# Altium footprint library Project_Oshinoko.PcbLib: 211 footprints (part 12 of 14)
Each footprint in its own frame and in the unit in brackets; x right, y up, seen from the top. Pads: shape width x height; smd on the part's side, far side on the other; paste and mask are expansions set on the pad; w line width, h text height; cw(c..) or ccw(c..) is an arc to the next point about the centre after c.
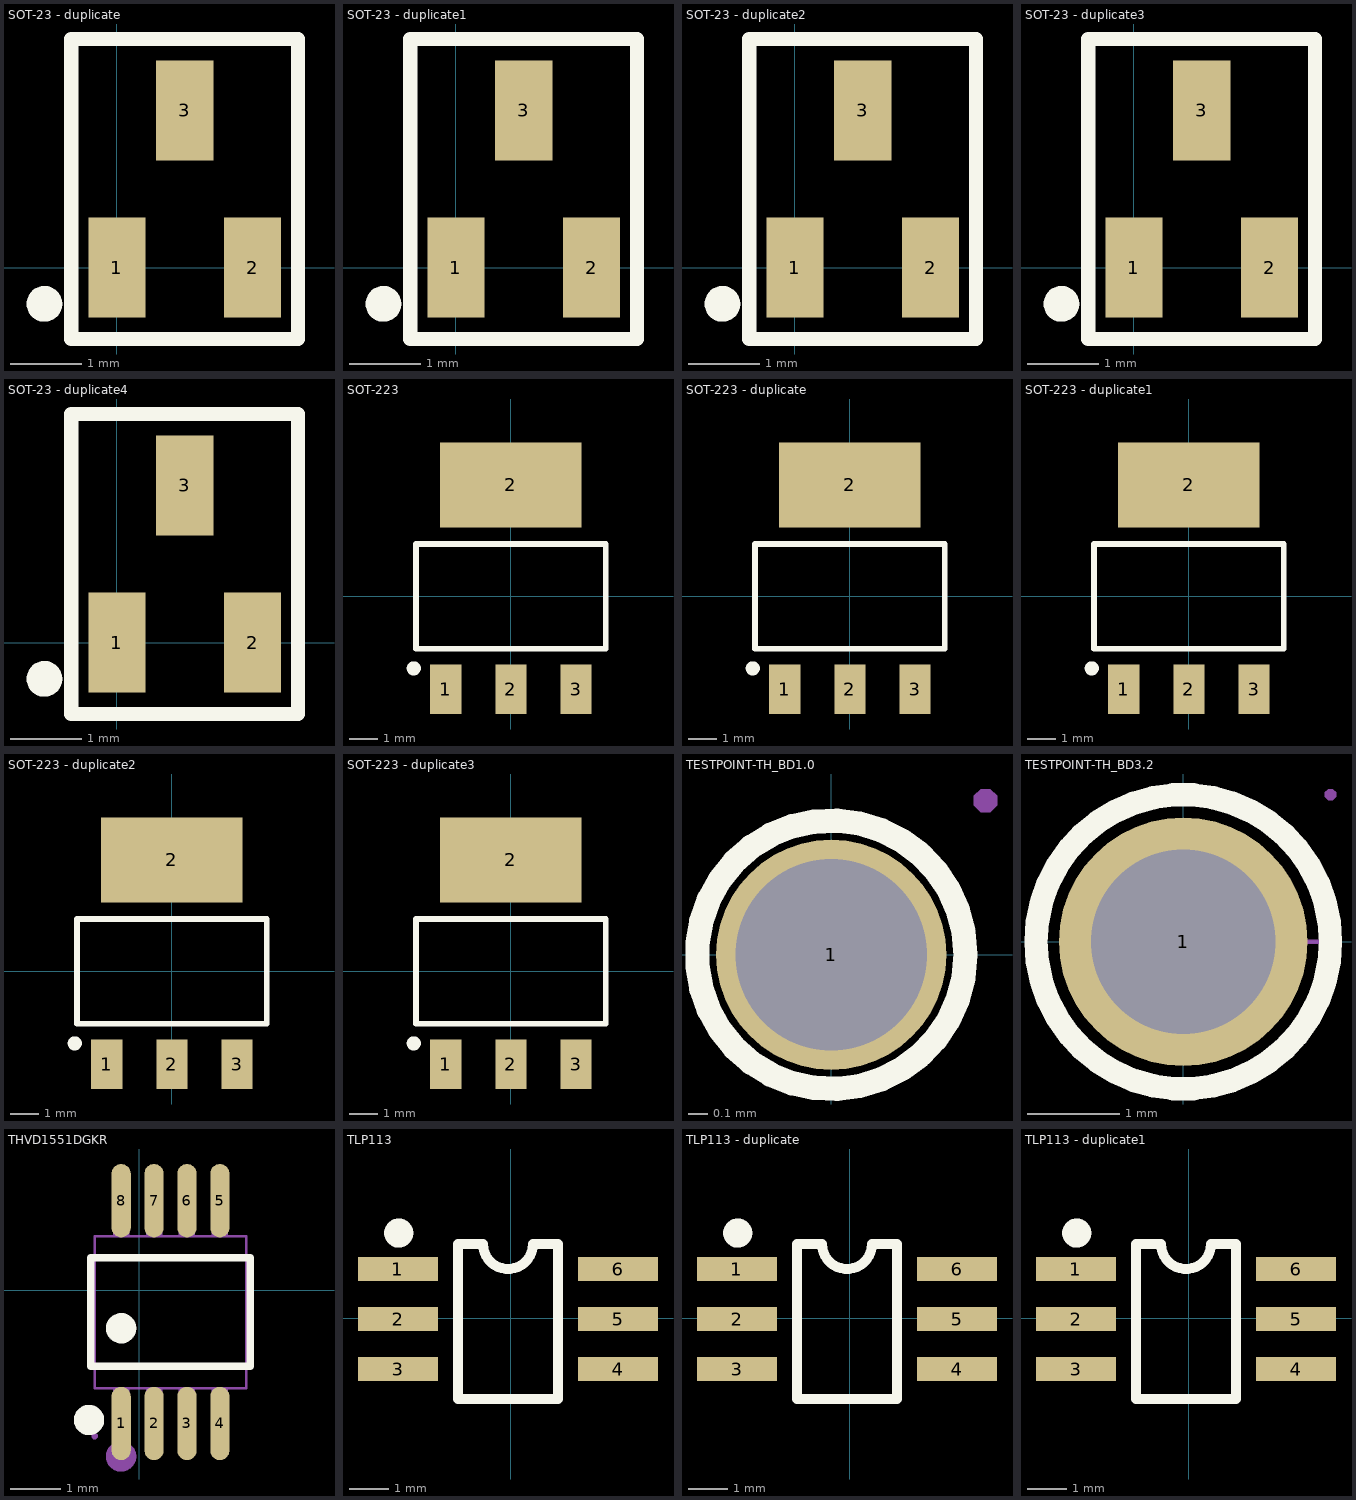
[diagram p11: the footprints below, top view; thin cyan lines are the x and y axes]

## SOT-23 - duplicate [mm]
pads (3):
  rect 0.8x1.4 smd: 1(0,0) 2(1.9,0) 3(0.95,2.2)
Top Overlay:
  circle w0.25: c-1.014,-0.508 r0.125
  lines w0.2: -0.637,-1 2.538,-1 2.538,3.2 -0.637,3.2 -0.637,-1

## SOT-23 - duplicate1 [mm]
pads (3):
  rect 0.8x1.4 smd: 1(0,0) 2(1.9,0) 3(0.95,2.2)
Top Overlay:
  circle w0.25: c-1.014,-0.508 r0.125
  lines w0.2: -0.637,-1 2.538,-1 2.538,3.2 -0.637,3.2 -0.637,-1

## SOT-23 - duplicate2 [mm]
pads (3):
  rect 0.8x1.4 smd: 1(0,0) 2(1.9,0) 3(0.95,2.2)
Top Overlay:
  circle w0.25: c-1.014,-0.508 r0.125
  lines w0.2: -0.637,-1 -0.637,3.2 2.538,3.2 2.538,-1 -0.637,-1

## SOT-23 - duplicate3 [mm]
pads (3):
  rect 0.8x1.4 smd: 1(0,0) 2(1.9,0) 3(0.95,2.2)
Top Overlay:
  circle w0.25: c-1.014,-0.508 r0.125
  lines w0.2: -0.637,-1 -0.637,3.2 2.538,3.2 2.538,-1 -0.637,-1

## SOT-23 - duplicate4 [mm]
pads (3):
  rect 0.8x1.4 smd: 1(0,0) 2(1.9,0) 3(0.95,2.2)
Top Overlay:
  circle w0.25: c-1.014,-0.508 r0.125
  lines w0.2: -0.637,-1 2.538,-1 2.538,3.2 -0.637,3.2 -0.637,-1

## SOT-223 [mm]
pads (4):
  rect 1.1x1.75 smd: 1(-2.3,-3.275) 2(0,-3.275) 3(2.3,-3.275)
  rect 5x3 smd: 2(0,3.937)
Top Overlay:
  circle w0.25: c-3.427,-2.54 r0.125
  lines w0.2: -3.35,-1.85 3.35,-1.85 3.35,1.85 -3.35,1.85 -3.35,-1.85

## SOT-223 - duplicate [mm]
pads (4):
  rect 1.1x1.75 smd: 1(-2.3,-3.275) 2(0,-3.275) 3(2.3,-3.275)
  rect 5x3 smd: 2(0,3.937)
Top Overlay:
  circle w0.25: c-3.427,-2.54 r0.125
  lines w0.2: -3.35,-1.85 -3.35,1.85 3.35,1.85 3.35,-1.85 -3.35,-1.85

## SOT-223 - duplicate1 [mm]
pads (4):
  rect 1.1x1.75 smd: 1(-2.3,-3.275) 2(0,-3.275) 3(2.3,-3.275)
  rect 5x3 smd: 2(0,3.937)
Top Overlay:
  circle w0.25: c-3.427,-2.54 r0.125
  lines w0.2: -3.35,-1.85 -3.35,1.85 3.35,1.85 3.35,-1.85 -3.35,-1.85

## SOT-223 - duplicate2 [mm]
pads (4):
  rect 1.1x1.75 smd: 1(-2.3,-3.275) 2(0,-3.275) 3(2.3,-3.275)
  rect 5x3 smd: 2(0,3.937)
Top Overlay:
  circle w0.25: c-3.427,-2.54 r0.125
  lines w0.2: -3.35,-1.85 -3.35,1.85 3.35,1.85 3.35,-1.85 -3.35,-1.85

## SOT-223 - duplicate3 [mm]
pads (4):
  rect 1.1x1.75 smd: 1(-2.3,-3.275) 2(0,-3.275) 3(2.3,-3.275)
  rect 5x3 smd: 2(0,3.937)
Top Overlay:
  circle w0.25: c-3.427,-2.54 r0.125
  lines w0.2: -3.35,-1.85 3.35,-1.85 3.35,1.85 -3.35,1.85 -3.35,-1.85

## TESTPOINT-TH_BD1.0 [mm]
pads (1):
  round 1.2 hole 1 paste+0 mask+0.05: 1(0,0)
Top Overlay:
  circle w0.127: c0,0 r0.7
Mechanical 15:
  region: 0.864,0.804 0.864,0.829 0.829,0.864 0.78,0.864 0.744,0.829 0.744,0.804 0.744,0.78 0.78,0.744 0.829,0.744 0.864,0.78 0.864,0.804

## TESTPOINT-TH_BD3.2 [mm]
pads (1):
  round 2.7 hole 2 paste+0 mask+0.05: 1(0,0)
Top Overlay:
  circle w0.254: c0,0 r1.6
Mechanical 15:
  region: 1.66,1.6 1.66,1.625 1.625,1.66 1.575,1.66 1.54,1.625 1.54,1.6 1.54,1.575 1.575,1.54 1.625,1.54 1.66,1.575 1.66,1.6
  region: -0.875,0.375 0.875,0.375 0.875,-0.375 -0.875,-0.375
  lines w0.051: 1.6,0 cw(c0,0) 0,-1.6 cw(c0,0) -1.6,0 cw(c0,0) 0,1.6 cw(c0,0) 1.6,0 ; 1.6,0 0,0 1.6,0

## THVD1551DGKR [mm]
pads (8):
  oval 0.38x1.45 smd: 1(-0.359,-2.629) 2(0.292,-2.629) 3(0.942,-2.629) 4(1.592,-2.629) 5(1.592,1.771) 6(0.942,1.771) 7(0.292,1.771) 8(-0.359,1.771)
Top Overlay:
  circle w0.3: c-0.993,-2.56 r0.15
  circle w0.3: c-0.359,-0.748 r0.15
  lines w0.152: -0.96,-1.5 2.193,-1.5 2.193,0.643 -0.96,0.643 -0.96,-1.5
Mechanical 6:
  circle w0.3: c-0.359,-3.279 r0.15
Mechanical 15:
  region: -0.516,-2.879 -0.516,-2.329 -0.201,-2.329 -0.201,-2.879
  region: -0.516,-2.339 -0.516,-1.919 -0.201,-1.919 -0.201,-2.339
  region: 0.134,-2.879 0.134,-2.329 0.449,-2.329 0.449,-2.879
  region: 0.134,-2.339 0.134,-1.919 0.449,-1.919 0.449,-2.339
  region: 0.784,-2.879 0.784,-2.329 1.099,-2.329 1.099,-2.879
  region: 0.784,-2.339 0.784,-1.919 1.099,-1.919 1.099,-2.339
  region: 1.434,-2.879 1.434,-2.329 1.749,-2.329 1.749,-2.879
  region: 1.434,-2.339 1.434,-1.919 1.749,-1.919 1.749,-2.339
  region: -0.516,1.471 -0.516,2.021 -0.201,2.021 -0.201,1.471
  region: -0.516,1.061 -0.516,1.481 -0.201,1.481 -0.201,1.061
  region: 0.134,1.471 0.134,2.021 0.449,2.021 0.449,1.471
  region: 0.134,1.061 0.134,1.481 0.449,1.481 0.449,1.061
  region: 0.784,1.471 0.784,2.021 1.099,2.021 1.099,1.471
  region: 0.784,1.061 0.784,1.481 1.099,1.481 1.099,1.061
  region: 1.434,1.471 1.434,2.021 1.749,2.021 1.749,1.471
  region: 1.434,1.061 1.434,1.481 1.749,1.481 1.749,1.061
  region: -0.823,-2.879 -0.824,-2.854 -0.859,-2.82 -0.908,-2.82 -0.943,-2.854 -0.943,-2.879 -0.943,-2.903 -0.908,-2.938 -0.859,-2.938 -0.824,-2.903 -0.823,-2.879
  lines w0.051: -0.884,-1.929 2.116,-1.929 2.116,1.071 -0.884,1.071 -0.884,-1.929

## TLP113 [mil]
pads (6):
  rect 80x24 smd: 1(-112.78,49.02) 2(-112.78,-0.98) 3(-112.78,-50.98) 4(107.22,-50.98) 5(107.22,-0.98) 6(107.22,49.02)
Top Overlay:
  circle w15: c-112.07,85 r7.07
  lines w10: -52.78,-80.98 47.22,-80.98 47.22,74.02 22.22,74.02 cw(c-2.78,74.02) -27.78,74.02 -52.78,74.02 -52.78,-80.98

## TLP113 - duplicate [mil]
pads (6):
  rect 80x24 smd: 1(-112.78,49.02) 2(-112.78,-0.98) 3(-112.78,-50.98) 4(107.22,-50.98) 5(107.22,-0.98) 6(107.22,49.02)
Top Overlay:
  circle w15: c-112.07,85 r7.07
  lines w10: -52.78,-80.98 47.22,-80.98 47.22,74.02 22.22,74.02 cw(c-2.78,74.02) -27.78,74.02 -52.78,74.02 -52.78,-80.98

## TLP113 - duplicate1 [mil]
pads (6):
  rect 80x24 smd: 1(-112.78,49.02) 2(-112.78,-0.98) 3(-112.78,-50.98) 4(107.22,-50.98) 5(107.22,-0.98) 6(107.22,49.02)
Top Overlay:
  circle w15: c-112.07,85 r7.07
  lines w10: -52.78,-80.98 47.22,-80.98 47.22,74.02 22.22,74.02 cw(c-2.78,74.02) -27.78,74.02 -52.78,74.02 -52.78,-80.98